# Altium schematic symbol library jlcpcb_2025_04_capacitors_extended_0402.schlib: 3594 symbols (part 18 of 20) (continued)
## RF15NR75B500CT (continued)
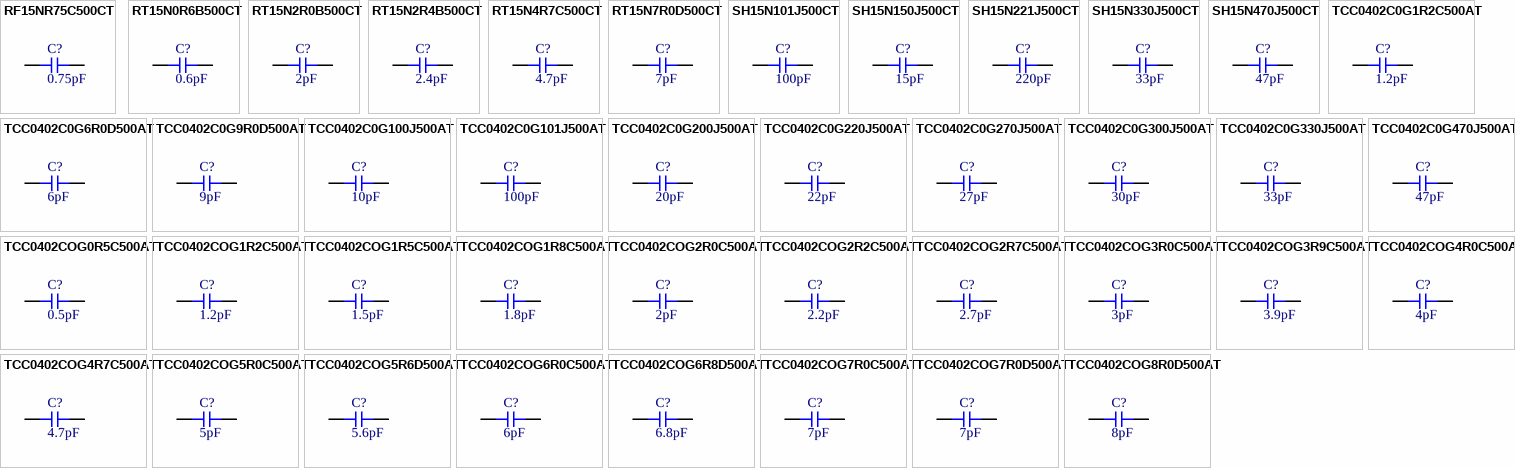
[diagram p81: symbols RF15NR75C500CT to TCC0402COG8R0D500AT]

## RF15NR75C500CT
designator C?  Capacitance: 0.75pF  (hidden comment: *)
Capacitor, Ceramic (MLCC), 0.75pF, 50V, NP0, SMD 0402; Manufacturer: Walsin Tech Corp; Manufacturer Part Number: RF15NR75C500CT; Package Size: 0402; JLCPCB Basic Part: No; JLCPCB Part Number: C304679; Supplier 1: LCSC; Category: Capacitors - MLCC; Supplier Part Number 1: C304679; Voltage Rating: 50V; Temperature Coefficient: NP0; RoHS: Yes; ComponentLink1Description: Datasheet; ComponentLink1URL: https://wmsc.lcsc.com/wmsc/upload/file/pdf/v2/lcsc/2304140030_Walsin-Tech-Corp-RF15NR75C500CT_C304679.pdf; ComponentLink2Description: JLCPCB Part URL; ComponentLink2URL: https://jlcpcb.com/partdetail/C304679; ComponentLink3Description: LCSC Part URL; ComponentLink3URL: https://lcsc.com/product-detail/Multilayer-Ceramic-Capacitors-MLCC---SMD-SMT_Walsin-Tech-Corp-Walsin-Tech-Corp-RF15NR75C500CT_C304679.html
footprint CAP-0402 (0402 (1005M) Capacitor)
pins: 1, 2

## RT15N0R6B500CT
designator C?  Capacitance: 0.6pF  (hidden comment: *)
Capacitor, Ceramic (MLCC), 0.6pF, 50V, NP0, SMD 0402; Manufacturer: Walsin Tech Corp; Manufacturer Part Number: RT15N0R6B500CT; Package Size: 0402; JLCPCB Basic Part: No; JLCPCB Part Number: C2918541; Supplier 1: LCSC; Category: Capacitors - MLCC; Supplier Part Number 1: C2918541; Voltage Rating: 50V; Temperature Coefficient: NP0; RoHS: Yes; ComponentLink1Description: Datasheet; ComponentLink1URL: https://wmsc.lcsc.com/wmsc/upload/file/pdf/v2/lcsc/2111171830_Walsin-Tech-Corp-RT15N0R6B500CT_C2918541.pdf; ComponentLink2Description: JLCPCB Part URL; ComponentLink2URL: https://jlcpcb.com/partdetail/C2918541; ComponentLink3Description: LCSC Part URL; ComponentLink3URL: https://lcsc.com/product-detail/Multilayer-Ceramic-Capacitors-MLCC---SMD-SMT_Walsin-Tech-Corp-Walsin-Tech-Corp-RT15N0R6B500CT_C2918541.html
footprint CAP-0402 (0402 (1005M) Capacitor)
pins: 1, 2

## RT15N2R0B500CT
designator C?  Capacitance: 2pF  (hidden comment: *)
Capacitor, Ceramic (MLCC), 2pF, 50V, NP0, SMD 0402; Manufacturer: Walsin Tech Corp; Manufacturer Part Number: RT15N2R0B500CT; Package Size: 0402; JLCPCB Basic Part: No; JLCPCB Part Number: C2918555; Supplier 1: LCSC; Category: Capacitors - MLCC; Supplier Part Number 1: C2918555; Voltage Rating: 50V; Temperature Coefficient: NP0; RoHS: Yes; ComponentLink1Description: Datasheet; ComponentLink1URL: https://wmsc.lcsc.com/wmsc/upload/file/pdf/v2/lcsc/2111171830_Walsin-Tech-Corp-RT15N2R0B500CT_C2918555.pdf; ComponentLink2Description: JLCPCB Part URL; ComponentLink2URL: https://jlcpcb.com/partdetail/C2918555; ComponentLink3Description: LCSC Part URL; ComponentLink3URL: https://lcsc.com/product-detail/Multilayer-Ceramic-Capacitors-MLCC---SMD-SMT_Walsin-Tech-Corp-Walsin-Tech-Corp-RT15N2R0B500CT_C2918555.html
footprint CAP-0402 (0402 (1005M) Capacitor)
pins: 1, 2

## RT15N2R4B500CT
designator C?  Capacitance: 2.4pF  (hidden comment: *)
Capacitor, Ceramic (MLCC), 2.4pF, 50V, NP0, SMD 0402; Manufacturer: Walsin Tech Corp; Manufacturer Part Number: RT15N2R4B500CT; Package Size: 0402; JLCPCB Basic Part: No; JLCPCB Part Number: C2918582; Supplier 1: LCSC; Category: Capacitors - MLCC; Supplier Part Number 1: C2918582; Voltage Rating: 50V; Temperature Coefficient: NP0; RoHS: Yes; ComponentLink1Description: Datasheet; ComponentLink1URL: https://wmsc.lcsc.com/wmsc/upload/file/pdf/v2/lcsc/2111171830_Walsin-Tech-Corp-RT15N2R4B500CT_C2918582.pdf; ComponentLink2Description: JLCPCB Part URL; ComponentLink2URL: https://jlcpcb.com/partdetail/C2918582; ComponentLink3Description: LCSC Part URL; ComponentLink3URL: https://lcsc.com/product-detail/Multilayer-Ceramic-Capacitors-MLCC---SMD-SMT_Walsin-Tech-Corp-Walsin-Tech-Corp-RT15N2R4B500CT_C2918582.html
footprint CAP-0402 (0402 (1005M) Capacitor)
pins: 1, 2

## RT15N4R7C500CT
designator C?  Capacitance: 4.7pF  (hidden comment: *)
Capacitor, Ceramic (MLCC), 4.7pF, 50V, NP0, SMD 0402; Manufacturer: Walsin Tech Corp; Manufacturer Part Number: RT15N4R7C500CT; Package Size: 0402; JLCPCB Basic Part: No; JLCPCB Part Number: C2918598; Supplier 1: LCSC; Category: Capacitors - MLCC; Supplier Part Number 1: C2918598; Voltage Rating: 50V; Temperature Coefficient: NP0; RoHS: Yes; ComponentLink1Description: Datasheet; ComponentLink1URL: https://wmsc.lcsc.com/wmsc/upload/file/pdf/v2/lcsc/2111171830_Walsin-Tech-Corp-RT15N4R7C500CT_C2918598.pdf; ComponentLink2Description: JLCPCB Part URL; ComponentLink2URL: https://jlcpcb.com/partdetail/C2918598; ComponentLink3Description: LCSC Part URL; ComponentLink3URL: https://lcsc.com/product-detail/Multilayer-Ceramic-Capacitors-MLCC---SMD-SMT_Walsin-Tech-Corp-Walsin-Tech-Corp-RT15N4R7C500CT_C2918598.html
footprint CAP-0402 (0402 (1005M) Capacitor)
pins: 1, 2

## RT15N7R0D500CT
designator C?  Capacitance: 7pF  (hidden comment: *)
Capacitor, Ceramic (MLCC), 7pF, 50V, NP0, SMD 0402; Manufacturer: Walsin Tech Corp; Manufacturer Part Number: RT15N7R0D500CT; Package Size: 0402; JLCPCB Basic Part: No; JLCPCB Part Number: C2918529; Supplier 1: LCSC; Category: Capacitors - MLCC; Supplier Part Number 1: C2918529; Voltage Rating: 50V; Temperature Coefficient: NP0; RoHS: Yes; ComponentLink1Description: Datasheet; ComponentLink1URL: https://wmsc.lcsc.com/wmsc/upload/file/pdf/v2/lcsc/2111171830_Walsin-Tech-Corp-RT15N7R0D500CT_C2918529.pdf; ComponentLink2Description: JLCPCB Part URL; ComponentLink2URL: https://jlcpcb.com/partdetail/C2918529; ComponentLink3Description: LCSC Part URL; ComponentLink3URL: https://lcsc.com/product-detail/Multilayer-Ceramic-Capacitors-MLCC---SMD-SMT_Walsin-Tech-Corp-Walsin-Tech-Corp-RT15N7R0D500CT_C2918529.html
footprint CAP-0402 (0402 (1005M) Capacitor)
pins: 1, 2

## SH15N101J500CT
designator C?  Capacitance: 100pF  (hidden comment: *)
Capacitor, Ceramic (MLCC), 100pF, ±5%, 50V, NP0, ±5%, SMD 0402; Manufacturer: Walsin Tech Corp; Manufacturer Part Number: SH15N101J500CT; Package Size: 0402; JLCPCB Basic Part: No; JLCPCB Part Number: C396886; Supplier 1: LCSC; Category: Capacitors - MLCC; Supplier Part Number 1: C396886; Tolerance: ±5%; Voltage Rating: 50V; Temperature Coefficient: NP0; RoHS: Yes; ComponentLink1Description: Datasheet; ComponentLink1URL: https://wmsc.lcsc.com/wmsc/upload/file/pdf/v2/lcsc/2304140030_Walsin-Tech-Corp-SH15N101J500CT_C396886.pdf; ComponentLink2Description: JLCPCB Part URL; ComponentLink2URL: https://jlcpcb.com/partdetail/C396886; ComponentLink3Description: LCSC Part URL; ComponentLink3URL: https://lcsc.com/product-detail/Multilayer-Ceramic-Capacitors-MLCC---SMD-SMT_Walsin-Tech-Corp-Walsin-Tech-Corp-SH15N101J500CT_C396886.html
footprint CAP-0402 (0402 (1005M) Capacitor)
pins: 1, 2

## SH15N150J500CT
designator C?  Capacitance: 15pF  (hidden comment: *)
Capacitor, Ceramic (MLCC), 15pF, ±5%, 50V, NP0, ±5%, SMD 0402; Manufacturer: Walsin Tech Corp; Manufacturer Part Number: SH15N150J500CT; Package Size: 0402; JLCPCB Basic Part: No; JLCPCB Part Number: C396888; Supplier 1: LCSC; Category: Capacitors - MLCC; Supplier Part Number 1: C396888; Tolerance: ±5%; Voltage Rating: 50V; Temperature Coefficient: NP0; RoHS: Yes; ComponentLink1Description: Datasheet; ComponentLink1URL: https://wmsc.lcsc.com/wmsc/upload/file/pdf/v2/lcsc/2304140030_Walsin-Tech-Corp-SH15N150J500CT_C396888.pdf; ComponentLink2Description: JLCPCB Part URL; ComponentLink2URL: https://jlcpcb.com/partdetail/C396888; ComponentLink3Description: LCSC Part URL; ComponentLink3URL: https://lcsc.com/product-detail/Multilayer-Ceramic-Capacitors-MLCC---SMD-SMT_Walsin-Tech-Corp-Walsin-Tech-Corp-SH15N150J500CT_C396888.html
footprint CAP-0402 (0402 (1005M) Capacitor)
pins: 1, 2

## SH15N221J500CT
designator C?  Capacitance: 220pF  (hidden comment: *)
Capacitor, Ceramic (MLCC), 220pF, ±5%, 50V, NP0, ±5%, SMD 0402; Manufacturer: Walsin Tech Corp; Manufacturer Part Number: SH15N221J500CT; Package Size: 0402; JLCPCB Basic Part: No; JLCPCB Part Number: C396890; Supplier 1: LCSC; Category: Capacitors - MLCC; Supplier Part Number 1: C396890; Tolerance: ±5%; Voltage Rating: 50V; Temperature Coefficient: NP0; RoHS: Yes; ComponentLink1Description: Datasheet; ComponentLink1URL: https://wmsc.lcsc.com/wmsc/upload/file/pdf/v2/lcsc/2304140030_Walsin-Tech-Corp-SH15N221J500CT_C396890.pdf; ComponentLink2Description: JLCPCB Part URL; ComponentLink2URL: https://jlcpcb.com/partdetail/C396890; ComponentLink3Description: LCSC Part URL; ComponentLink3URL: https://lcsc.com/product-detail/Multilayer-Ceramic-Capacitors-MLCC---SMD-SMT_Walsin-Tech-Corp-Walsin-Tech-Corp-SH15N221J500CT_C396890.html
footprint CAP-0402 (0402 (1005M) Capacitor)
pins: 1, 2

## SH15N330J500CT
designator C?  Capacitance: 33pF  (hidden comment: *)
Capacitor, Ceramic (MLCC), 33pF, ±5%, 50V, NP0, ±5%, SMD 0402; Manufacturer: Walsin Tech Corp; Manufacturer Part Number: SH15N330J500CT; Package Size: 0402; JLCPCB Basic Part: No; JLCPCB Part Number: C396891; Supplier 1: LCSC; Category: Capacitors - MLCC; Supplier Part Number 1: C396891; Tolerance: ±5%; Voltage Rating: 50V; Temperature Coefficient: NP0; RoHS: Yes; ComponentLink1Description: Datasheet; ComponentLink1URL: https://wmsc.lcsc.com/wmsc/upload/file/pdf/v2/lcsc/2304140030_Walsin-Tech-Corp-SH15N330J500CT_C396891.pdf; ComponentLink2Description: JLCPCB Part URL; ComponentLink2URL: https://jlcpcb.com/partdetail/C396891; ComponentLink3Description: LCSC Part URL; ComponentLink3URL: https://lcsc.com/product-detail/Multilayer-Ceramic-Capacitors-MLCC---SMD-SMT_Walsin-Tech-Corp-Walsin-Tech-Corp-SH15N330J500CT_C396891.html
footprint CAP-0402 (0402 (1005M) Capacitor)
pins: 1, 2

## SH15N470J500CT
designator C?  Capacitance: 47pF  (hidden comment: *)
Capacitor, Ceramic (MLCC), 47pF, ±5%, 50V, NP0, ±5%, SMD 0402; Manufacturer: Walsin Tech Corp; Manufacturer Part Number: SH15N470J500CT; Package Size: 0402; JLCPCB Basic Part: No; JLCPCB Part Number: C396892; Supplier 1: LCSC; Category: Capacitors - MLCC; Supplier Part Number 1: C396892; Tolerance: ±5%; Voltage Rating: 50V; Temperature Coefficient: NP0; RoHS: Yes; ComponentLink1Description: Datasheet; ComponentLink1URL: https://wmsc.lcsc.com/wmsc/upload/file/pdf/v2/lcsc/1912111437_Walsin-Tech-Corp-SH15N470J500CT_C396892.pdf; ComponentLink2Description: JLCPCB Part URL; ComponentLink2URL: https://jlcpcb.com/partdetail/C396892; ComponentLink3Description: LCSC Part URL; ComponentLink3URL: https://lcsc.com/product-detail/Multilayer-Ceramic-Capacitors-MLCC---SMD-SMT_Walsin-Tech-Corp-Walsin-Tech-Corp-SH15N470J500CT_C396892.html
footprint CAP-0402 (0402 (1005M) Capacitor)
pins: 1, 2

## TCC0402C0G1R2C500AT
designator C?  Capacitance: 1.2pF  (hidden comment: *)
Capacitor, Ceramic (MLCC), 1.2pF, 50V, C0G, SMD 0402; Manufacturer: CCTC; Manufacturer Part Number: TCC0402C0G1R2C500AT; Package Size: 0402; JLCPCB Basic Part: No; JLCPCB Part Number: C466224; Supplier 1: LCSC; Category: Capacitors - MLCC; Supplier Part Number 1: C466224; Voltage Rating: 50V; Temperature Coefficient: C0G; RoHS: Yes; ComponentLink1Description: Datasheet; ComponentLink1URL: https://wmsc.lcsc.com/wmsc/upload/file/pdf/v2/lcsc/2304140030_CCTC-TCC0402C0G1R2C500AT_C466224.pdf; ComponentLink2Description: JLCPCB Part URL; ComponentLink2URL: https://jlcpcb.com/partdetail/C466224; ComponentLink3Description: LCSC Part URL; ComponentLink3URL: https://lcsc.com/product-detail/Multilayer-Ceramic-Capacitors-MLCC---SMD-SMT_CCTC-CCTC-TCC0402C0G1R2C500AT_C466224.html
footprint CAP-0402 (0402 (1005M) Capacitor)
pins: 1, 2

## TCC0402C0G6R0D500AT
designator C?  Capacitance: 6pF  (hidden comment: *)
Capacitor, Ceramic (MLCC), 6pF, 50V, C0G, SMD 0402; Manufacturer: CCTC; Manufacturer Part Number: TCC0402C0G6R0D500AT; Package Size: 0402; JLCPCB Basic Part: No; JLCPCB Part Number: C466231; Supplier 1: LCSC; Category: Capacitors - MLCC; Supplier Part Number 1: C466231; Voltage Rating: 50V; Temperature Coefficient: C0G; RoHS: Yes; ComponentLink1Description: Datasheet; ComponentLink1URL: https://wmsc.lcsc.com/wmsc/upload/file/pdf/v2/lcsc/2304140030_CCTC-TCC0402C0G6R0D500AT_C466231.pdf; ComponentLink2Description: JLCPCB Part URL; ComponentLink2URL: https://jlcpcb.com/partdetail/C466231; ComponentLink3Description: LCSC Part URL; ComponentLink3URL: https://lcsc.com/product-detail/Multilayer-Ceramic-Capacitors-MLCC---SMD-SMT_CCTC-CCTC-TCC0402C0G6R0D500AT_C466231.html
footprint CAP-0402 (0402 (1005M) Capacitor)
pins: 1, 2

## TCC0402C0G9R0D500AT
designator C?  Capacitance: 9pF  (hidden comment: *)
Capacitor, Ceramic (MLCC), 9pF, 50V, C0G, SMD 0402; Manufacturer: CCTC; Manufacturer Part Number: TCC0402C0G9R0D500AT; Package Size: 0402; JLCPCB Basic Part: No; JLCPCB Part Number: C466232; Supplier 1: LCSC; Category: Capacitors - MLCC; Supplier Part Number 1: C466232; Voltage Rating: 50V; Temperature Coefficient: C0G; RoHS: Yes; ComponentLink1Description: Datasheet; ComponentLink1URL: https://wmsc.lcsc.com/wmsc/upload/file/pdf/v2/lcsc/2304140030_CCTC-TCC0402C0G9R0D500AT_C466232.pdf; ComponentLink2Description: JLCPCB Part URL; ComponentLink2URL: https://jlcpcb.com/partdetail/C466232; ComponentLink3Description: LCSC Part URL; ComponentLink3URL: https://lcsc.com/product-detail/Multilayer-Ceramic-Capacitors-MLCC---SMD-SMT_CCTC-CCTC-TCC0402C0G9R0D500AT_C466232.html
footprint CAP-0402 (0402 (1005M) Capacitor)
pins: 1, 2

## TCC0402C0G100J500AT
designator C?  Capacitance: 10pF  (hidden comment: *)
Capacitor, Ceramic (MLCC), 10pF, ±5%, 50V, C0G, ±5%, SMD 0402; Manufacturer: CCTC; Manufacturer Part Number: TCC0402C0G100J500AT; Package Size: 0402; JLCPCB Basic Part: No; JLCPCB Part Number: C466222; Supplier 1: LCSC; Category: Capacitors - MLCC; Supplier Part Number 1: C466222; Tolerance: ±5%; Voltage Rating: 50V; Temperature Coefficient: C0G; RoHS: Yes; ComponentLink1Description: Datasheet; ComponentLink1URL: https://wmsc.lcsc.com/wmsc/upload/file/pdf/v2/lcsc/2304140030_CCTC-TCC0402C0G100J500AT_C466222.pdf; ComponentLink2Description: JLCPCB Part URL; ComponentLink2URL: https://jlcpcb.com/partdetail/C466222; ComponentLink3Description: LCSC Part URL; ComponentLink3URL: https://lcsc.com/product-detail/Multilayer-Ceramic-Capacitors-MLCC---SMD-SMT_CCTC-CCTC-TCC0402C0G100J500AT_C466222.html
footprint CAP-0402 (0402 (1005M) Capacitor)
pins: 1, 2

## TCC0402C0G101J500AT
designator C?  Capacitance: 100pF  (hidden comment: *)
Capacitor, Ceramic (MLCC), 100pF, ±5%, 50V, C0G, ±5%, SMD 0402; Manufacturer: CCTC; Manufacturer Part Number: TCC0402C0G101J500AT; Package Size: 0402; JLCPCB Basic Part: No; JLCPCB Part Number: C466223; Supplier 1: LCSC; Category: Capacitors - MLCC; Supplier Part Number 1: C466223; Tolerance: ±5%; Voltage Rating: 50V; Temperature Coefficient: C0G; RoHS: Yes; ComponentLink1Description: Datasheet; ComponentLink1URL: https://wmsc.lcsc.com/wmsc/upload/file/pdf/v2/lcsc/2304140030_CCTC-TCC0402C0G101J500AT_C466223.pdf; ComponentLink2Description: JLCPCB Part URL; ComponentLink2URL: https://jlcpcb.com/partdetail/C466223; ComponentLink3Description: LCSC Part URL; ComponentLink3URL: https://lcsc.com/product-detail/Multilayer-Ceramic-Capacitors-MLCC---SMD-SMT_CCTC-CCTC-TCC0402C0G101J500AT_C466223.html
footprint CAP-0402 (0402 (1005M) Capacitor)
pins: 1, 2

## TCC0402C0G200J500AT
designator C?  Capacitance: 20pF  (hidden comment: *)
Capacitor, Ceramic (MLCC), 20pF, ±5%, 50V, C0G, ±5%, SMD 0402; Manufacturer: CCTC; Manufacturer Part Number: TCC0402C0G200J500AT; Package Size: 0402; JLCPCB Basic Part: No; JLCPCB Part Number: C466225; Supplier 1: LCSC; Category: Capacitors - MLCC; Supplier Part Number 1: C466225; Tolerance: ±5%; Voltage Rating: 50V; Temperature Coefficient: C0G; RoHS: Yes; ComponentLink1Description: Datasheet; ComponentLink1URL: https://wmsc.lcsc.com/wmsc/upload/file/pdf/v2/lcsc/2304140030_CCTC-TCC0402C0G200J500AT_C466225.pdf; ComponentLink2Description: JLCPCB Part URL; ComponentLink2URL: https://jlcpcb.com/partdetail/C466225; ComponentLink3Description: LCSC Part URL; ComponentLink3URL: https://lcsc.com/product-detail/Multilayer-Ceramic-Capacitors-MLCC---SMD-SMT_CCTC-CCTC-TCC0402C0G200J500AT_C466225.html
footprint CAP-0402 (0402 (1005M) Capacitor)
pins: 1, 2

## TCC0402C0G220J500AT
designator C?  Capacitance: 22pF  (hidden comment: *)
Capacitor, Ceramic (MLCC), 22pF, ±5%, 50V, C0G, ±5%, SMD 0402; Manufacturer: CCTC; Manufacturer Part Number: TCC0402C0G220J500AT; Package Size: 0402; JLCPCB Basic Part: No; JLCPCB Part Number: C466226; Supplier 1: LCSC; Category: Capacitors - MLCC; Supplier Part Number 1: C466226; Tolerance: ±5%; Voltage Rating: 50V; Temperature Coefficient: C0G; RoHS: Yes; ComponentLink1Description: Datasheet; ComponentLink1URL: https://wmsc.lcsc.com/wmsc/upload/file/pdf/v2/lcsc/2304140030_CCTC-TCC0402C0G220J500AT_C466226.pdf; ComponentLink2Description: JLCPCB Part URL; ComponentLink2URL: https://jlcpcb.com/partdetail/C466226; ComponentLink3Description: LCSC Part URL; ComponentLink3URL: https://lcsc.com/product-detail/Multilayer-Ceramic-Capacitors-MLCC---SMD-SMT_CCTC-CCTC-TCC0402C0G220J500AT_C466226.html
footprint CAP-0402 (0402 (1005M) Capacitor)
pins: 1, 2

## TCC0402C0G270J500AT
designator C?  Capacitance: 27pF  (hidden comment: *)
Capacitor, Ceramic (MLCC), 27pF, ±5%, 50V, C0G, ±5%, SMD 0402; Manufacturer: CCTC; Manufacturer Part Number: TCC0402C0G270J500AT; Package Size: 0402; JLCPCB Basic Part: No; JLCPCB Part Number: C466227; Supplier 1: LCSC; Category: Capacitors - MLCC; Supplier Part Number 1: C466227; Tolerance: ±5%; Voltage Rating: 50V; Temperature Coefficient: C0G; RoHS: Yes; ComponentLink1Description: Datasheet; ComponentLink1URL: https://wmsc.lcsc.com/wmsc/upload/file/pdf/v2/lcsc/2304140030_CCTC-TCC0402C0G270J500AT_C466227.pdf; ComponentLink2Description: JLCPCB Part URL; ComponentLink2URL: https://jlcpcb.com/partdetail/C466227; ComponentLink3Description: LCSC Part URL; ComponentLink3URL: https://lcsc.com/product-detail/Multilayer-Ceramic-Capacitors-MLCC---SMD-SMT_CCTC-CCTC-TCC0402C0G270J500AT_C466227.html
footprint CAP-0402 (0402 (1005M) Capacitor)
pins: 1, 2

## TCC0402C0G300J500AT
designator C?  Capacitance: 30pF  (hidden comment: *)
Capacitor, Ceramic (MLCC), 30pF, ±5%, 50V, C0G, ±5%, SMD 0402; Manufacturer: CCTC; Manufacturer Part Number: TCC0402C0G300J500AT; Package Size: 0402; JLCPCB Basic Part: No; JLCPCB Part Number: C466228; Supplier 1: LCSC; Category: Capacitors - MLCC; Supplier Part Number 1: C466228; Tolerance: ±5%; Voltage Rating: 50V; Temperature Coefficient: C0G; RoHS: Yes; ComponentLink1Description: Datasheet; ComponentLink1URL: https://wmsc.lcsc.com/wmsc/upload/file/pdf/v2/lcsc/2304140030_CCTC-TCC0402C0G300J500AT_C466228.pdf; ComponentLink2Description: JLCPCB Part URL; ComponentLink2URL: https://jlcpcb.com/partdetail/C466228; ComponentLink3Description: LCSC Part URL; ComponentLink3URL: https://lcsc.com/product-detail/Multilayer-Ceramic-Capacitors-MLCC---SMD-SMT_CCTC-CCTC-TCC0402C0G300J500AT_C466228.html
footprint CAP-0402 (0402 (1005M) Capacitor)
pins: 1, 2

## TCC0402C0G330J500AT
designator C?  Capacitance: 33pF  (hidden comment: *)
Capacitor, Ceramic (MLCC), 33pF, ±5%, 50V, C0G, ±5%, SMD 0402; Manufacturer: CCTC; Manufacturer Part Number: TCC0402C0G330J500AT; Package Size: 0402; JLCPCB Basic Part: No; JLCPCB Part Number: C466229; Supplier 1: LCSC; Category: Capacitors - MLCC; Supplier Part Number 1: C466229; Tolerance: ±5%; Voltage Rating: 50V; Temperature Coefficient: C0G; RoHS: Yes; ComponentLink1Description: Datasheet; ComponentLink1URL: https://wmsc.lcsc.com/wmsc/upload/file/pdf/v2/lcsc/2304140030_CCTC-TCC0402C0G330J500AT_C466229.pdf; ComponentLink2Description: JLCPCB Part URL; ComponentLink2URL: https://jlcpcb.com/partdetail/C466229; ComponentLink3Description: LCSC Part URL; ComponentLink3URL: https://lcsc.com/product-detail/Multilayer-Ceramic-Capacitors-MLCC---SMD-SMT_CCTC-CCTC-TCC0402C0G330J500AT_C466229.html
footprint CAP-0402 (0402 (1005M) Capacitor)
pins: 1, 2

## TCC0402C0G470J500AT
designator C?  Capacitance: 47pF  (hidden comment: *)
Capacitor, Ceramic (MLCC), 47pF, ±5%, 50V, C0G, ±5%, SMD 0402; Manufacturer: CCTC; Manufacturer Part Number: TCC0402C0G470J500AT; Package Size: 0402; JLCPCB Basic Part: No; JLCPCB Part Number: C466230; Supplier 1: LCSC; Category: Capacitors - MLCC; Supplier Part Number 1: C466230; Tolerance: ±5%; Voltage Rating: 50V; Temperature Coefficient: C0G; RoHS: Yes; ComponentLink1Description: Datasheet; ComponentLink1URL: https://wmsc.lcsc.com/wmsc/upload/file/pdf/v2/lcsc/2304140030_CCTC-TCC0402C0G470J500AT_C466230.pdf; ComponentLink2Description: JLCPCB Part URL; ComponentLink2URL: https://jlcpcb.com/partdetail/C466230; ComponentLink3Description: LCSC Part URL; ComponentLink3URL: https://lcsc.com/product-detail/Multilayer-Ceramic-Capacitors-MLCC---SMD-SMT_CCTC-CCTC-TCC0402C0G470J500AT_C466230.html
footprint CAP-0402 (0402 (1005M) Capacitor)
pins: 1, 2

## TCC0402COG0R5C500AT
designator C?  Capacitance: 0.5pF  (hidden comment: *)
Capacitor, Ceramic (MLCC), 0.5pF, 50V, C0G, SMD 0402; Manufacturer: CCTC; Manufacturer Part Number: TCC0402COG0R5C500AT; Package Size: 0402; JLCPCB Basic Part: No; JLCPCB Part Number: C880655; Supplier 1: LCSC; Category: Capacitors - MLCC; Supplier Part Number 1: C880655; Voltage Rating: 50V; Temperature Coefficient: C0G; RoHS: Yes; ComponentLink1Description: Datasheet; ComponentLink1URL: https://wmsc.lcsc.com/wmsc/upload/file/pdf/v2/lcsc/2204121745_CCTC-TCC0402COG0R5C500AT_C880655.pdf; ComponentLink2Description: JLCPCB Part URL; ComponentLink2URL: https://jlcpcb.com/partdetail/C880655; ComponentLink3Description: LCSC Part URL; ComponentLink3URL: https://lcsc.com/product-detail/Multilayer-Ceramic-Capacitors-MLCC---SMD-SMT_CCTC-CCTC-TCC0402COG0R5C500AT_C880655.html
footprint CAP-0402 (0402 (1005M) Capacitor)
pins: 1, 2

## TCC0402COG1R2C500AT
designator C?  Capacitance: 1.2pF  (hidden comment: *)
Capacitor, Ceramic (MLCC), 1.2pF, 50V, C0G, SMD 0402; Manufacturer: CCTC; Manufacturer Part Number: TCC0402COG1R2C500AT; Package Size: 0402; JLCPCB Basic Part: No; JLCPCB Part Number: C880658; Supplier 1: LCSC; Category: Capacitors - MLCC; Supplier Part Number 1: C880658; Voltage Rating: 50V; Temperature Coefficient: C0G; RoHS: Yes; ComponentLink1Description: Datasheet; ComponentLink1URL: https://wmsc.lcsc.com/wmsc/upload/file/pdf/v2/lcsc/2304140030_CCTC-TCC0402COG1R2C500AT_C880658.pdf; ComponentLink2Description: JLCPCB Part URL; ComponentLink2URL: https://jlcpcb.com/partdetail/C880658; ComponentLink3Description: LCSC Part URL; ComponentLink3URL: https://lcsc.com/product-detail/Multilayer-Ceramic-Capacitors-MLCC---SMD-SMT_CCTC-CCTC-TCC0402COG1R2C500AT_C880658.html
footprint CAP-0402 (0402 (1005M) Capacitor)
pins: 1, 2

## TCC0402COG1R5C500AT
designator C?  Capacitance: 1.5pF  (hidden comment: *)
Capacitor, Ceramic (MLCC), 1.5pF, 50V, C0G, SMD 0402; Manufacturer: CCTC; Manufacturer Part Number: TCC0402COG1R5C500AT; Package Size: 0402; JLCPCB Basic Part: No; JLCPCB Part Number: C880661; Supplier 1: LCSC; Category: Capacitors - MLCC; Supplier Part Number 1: C880661; Voltage Rating: 50V; Temperature Coefficient: C0G; RoHS: Yes; ComponentLink1Description: Datasheet; ComponentLink1URL: https://wmsc.lcsc.com/wmsc/upload/file/pdf/v2/lcsc/2304140030_CCTC-TCC0402COG1R5C500AT_C880661.pdf; ComponentLink2Description: JLCPCB Part URL; ComponentLink2URL: https://jlcpcb.com/partdetail/C880661; ComponentLink3Description: LCSC Part URL; ComponentLink3URL: https://lcsc.com/product-detail/Multilayer-Ceramic-Capacitors-MLCC---SMD-SMT_CCTC-CCTC-TCC0402COG1R5C500AT_C880661.html
footprint CAP-0402 (0402 (1005M) Capacitor)
pins: 1, 2

## TCC0402COG1R8C500AT
designator C?  Capacitance: 1.8pF  (hidden comment: *)
Capacitor, Ceramic (MLCC), 1.8pF, 50V, C0G, SMD 0402; Manufacturer: CCTC; Manufacturer Part Number: TCC0402COG1R8C500AT; Package Size: 0402; JLCPCB Basic Part: No; JLCPCB Part Number: C880631; Supplier 1: LCSC; Category: Capacitors - MLCC; Supplier Part Number 1: C880631; Voltage Rating: 50V; Temperature Coefficient: C0G; RoHS: Yes; ComponentLink1Description: Datasheet; ComponentLink1URL: https://wmsc.lcsc.com/wmsc/upload/file/pdf/v2/lcsc/2304140030_CCTC-TCC0402COG1R8C500AT_C880631.pdf; ComponentLink2Description: JLCPCB Part URL; ComponentLink2URL: https://jlcpcb.com/partdetail/C880631; ComponentLink3Description: LCSC Part URL; ComponentLink3URL: https://lcsc.com/product-detail/Multilayer-Ceramic-Capacitors-MLCC---SMD-SMT_CCTC-CCTC-TCC0402COG1R8C500AT_C880631.html
footprint CAP-0402 (0402 (1005M) Capacitor)
pins: 1, 2

## TCC0402COG2R0C500AT
designator C?  Capacitance: 2pF  (hidden comment: *)
Capacitor, Ceramic (MLCC), 2pF, 50V, C0G, SMD 0402; Manufacturer: CCTC; Manufacturer Part Number: TCC0402COG2R0C500AT; Package Size: 0402; JLCPCB Basic Part: No; JLCPCB Part Number: C696885; Supplier 1: LCSC; Category: Capacitors - MLCC; Supplier Part Number 1: C696885; Voltage Rating: 50V; Temperature Coefficient: C0G; RoHS: Yes; ComponentLink1Description: Datasheet; ComponentLink1URL: https://wmsc.lcsc.com/wmsc/upload/file/pdf/v2/lcsc/2304140030_CCTC-TCC0402COG2R0C500AT_C696885.pdf; ComponentLink2Description: JLCPCB Part URL; ComponentLink2URL: https://jlcpcb.com/partdetail/C696885; ComponentLink3Description: LCSC Part URL; ComponentLink3URL: https://lcsc.com/product-detail/Multilayer-Ceramic-Capacitors-MLCC---SMD-SMT_CCTC-CCTC-TCC0402COG2R0C500AT_C696885.html
footprint CAP-0402 (0402 (1005M) Capacitor)
pins: 1, 2

## TCC0402COG2R2C500AT
designator C?  Capacitance: 2.2pF  (hidden comment: *)
Capacitor, Ceramic (MLCC), 2.2pF, 50V, C0G, SMD 0402; Manufacturer: CCTC; Manufacturer Part Number: TCC0402COG2R2C500AT; Package Size: 0402; JLCPCB Basic Part: No; JLCPCB Part Number: C880648; Supplier 1: LCSC; Category: Capacitors - MLCC; Supplier Part Number 1: C880648; Voltage Rating: 50V; Temperature Coefficient: C0G; RoHS: Yes; ComponentLink1Description: Datasheet; ComponentLink1URL: https://wmsc.lcsc.com/wmsc/upload/file/pdf/v2/lcsc/2304140030_CCTC-TCC0402COG2R2C500AT_C880648.pdf; ComponentLink2Description: JLCPCB Part URL; ComponentLink2URL: https://jlcpcb.com/partdetail/C880648; ComponentLink3Description: LCSC Part URL; ComponentLink3URL: https://lcsc.com/product-detail/Multilayer-Ceramic-Capacitors-MLCC---SMD-SMT_CCTC-CCTC-TCC0402COG2R2C500AT_C880648.html
footprint CAP-0402 (0402 (1005M) Capacitor)
pins: 1, 2

## TCC0402COG2R7C500AT
designator C?  Capacitance: 2.7pF  (hidden comment: *)
Capacitor, Ceramic (MLCC), 2.7pF, 50V, C0G, SMD 0402; Manufacturer: CCTC; Manufacturer Part Number: TCC0402COG2R7C500AT; Package Size: 0402; JLCPCB Basic Part: No; JLCPCB Part Number: C696884; Supplier 1: LCSC; Category: Capacitors - MLCC; Supplier Part Number 1: C696884; Voltage Rating: 50V; Temperature Coefficient: C0G; RoHS: Yes; ComponentLink1Description: Datasheet; ComponentLink1URL: https://wmsc.lcsc.com/wmsc/upload/file/pdf/v2/lcsc/2304140030_CCTC-TCC0402COG2R7C500AT_C696884.pdf; ComponentLink2Description: JLCPCB Part URL; ComponentLink2URL: https://jlcpcb.com/partdetail/C696884; ComponentLink3Description: LCSC Part URL; ComponentLink3URL: https://lcsc.com/product-detail/Multilayer-Ceramic-Capacitors-MLCC---SMD-SMT_CCTC-CCTC-TCC0402COG2R7C500AT_C696884.html
footprint CAP-0402 (0402 (1005M) Capacitor)
pins: 1, 2

## TCC0402COG3R0C500AT
designator C?  Capacitance: 3pF  (hidden comment: *)
Capacitor, Ceramic (MLCC), 3pF, 50V, C0G, SMD 0402; Manufacturer: CCTC; Manufacturer Part Number: TCC0402COG3R0C500AT; Package Size: 0402; JLCPCB Basic Part: No; JLCPCB Part Number: C696883; Supplier 1: LCSC; Category: Capacitors - MLCC; Supplier Part Number 1: C696883; Voltage Rating: 50V; Temperature Coefficient: C0G; RoHS: Yes; ComponentLink1Description: Datasheet; ComponentLink1URL: https://wmsc.lcsc.com/wmsc/upload/file/pdf/v2/lcsc/2304140030_CCTC-TCC0402COG3R0C500AT_C696883.pdf; ComponentLink2Description: JLCPCB Part URL; ComponentLink2URL: https://jlcpcb.com/partdetail/C696883; ComponentLink3Description: LCSC Part URL; ComponentLink3URL: https://lcsc.com/product-detail/Multilayer-Ceramic-Capacitors-MLCC---SMD-SMT_CCTC-CCTC-TCC0402COG3R0C500AT_C696883.html
footprint CAP-0402 (0402 (1005M) Capacitor)
pins: 1, 2

## TCC0402COG3R9C500AT
designator C?  Capacitance: 3.9pF  (hidden comment: *)
Capacitor, Ceramic (MLCC), 3.9pF, 50V, C0G, SMD 0402; Manufacturer: CCTC; Manufacturer Part Number: TCC0402COG3R9C500AT; Package Size: 0402; JLCPCB Basic Part: No; JLCPCB Part Number: C696882; Supplier 1: LCSC; Category: Capacitors - MLCC; Supplier Part Number 1: C696882; Voltage Rating: 50V; Temperature Coefficient: C0G; RoHS: Yes; ComponentLink1Description: Datasheet; ComponentLink1URL: https://wmsc.lcsc.com/wmsc/upload/file/pdf/v2/lcsc/2304140030_CCTC-TCC0402COG3R9C500AT_C696882.pdf; ComponentLink2Description: JLCPCB Part URL; ComponentLink2URL: https://jlcpcb.com/partdetail/C696882; ComponentLink3Description: LCSC Part URL; ComponentLink3URL: https://lcsc.com/product-detail/Multilayer-Ceramic-Capacitors-MLCC---SMD-SMT_CCTC-CCTC-TCC0402COG3R9C500AT_C696882.html
footprint CAP-0402 (0402 (1005M) Capacitor)
pins: 1, 2

## TCC0402COG4R0C500AT
designator C?  Capacitance: 4pF  (hidden comment: *)
Capacitor, Ceramic (MLCC), 4pF, 50V, C0G, SMD 0402; Manufacturer: CCTC; Manufacturer Part Number: TCC0402COG4R0C500AT; Package Size: 0402; JLCPCB Basic Part: No; JLCPCB Part Number: C696875; Supplier 1: LCSC; Category: Capacitors - MLCC; Supplier Part Number 1: C696875; Voltage Rating: 50V; Temperature Coefficient: C0G; RoHS: Yes; ComponentLink1Description: Datasheet; ComponentLink1URL: https://wmsc.lcsc.com/wmsc/upload/file/pdf/v2/lcsc/2304140030_CCTC-TCC0402COG4R0C500AT_C696875.pdf; ComponentLink2Description: JLCPCB Part URL; ComponentLink2URL: https://jlcpcb.com/partdetail/C696875; ComponentLink3Description: LCSC Part URL; ComponentLink3URL: https://lcsc.com/product-detail/Multilayer-Ceramic-Capacitors-MLCC---SMD-SMT_CCTC-CCTC-TCC0402COG4R0C500AT_C696875.html
footprint CAP-0402 (0402 (1005M) Capacitor)
pins: 1, 2

## TCC0402COG4R7C500AT
designator C?  Capacitance: 4.7pF  (hidden comment: *)
Capacitor, Ceramic (MLCC), 4.7pF, 50V, C0G, SMD 0402; Manufacturer: CCTC; Manufacturer Part Number: TCC0402COG4R7C500AT; Package Size: 0402; JLCPCB Basic Part: No; JLCPCB Part Number: C696881; Supplier 1: LCSC; Category: Capacitors - MLCC; Supplier Part Number 1: C696881; Voltage Rating: 50V; Temperature Coefficient: C0G; RoHS: Yes; ComponentLink1Description: Datasheet; ComponentLink1URL: https://wmsc.lcsc.com/wmsc/upload/file/pdf/v2/lcsc/2304140030_CCTC-TCC0402COG4R7C500AT_C696881.pdf; ComponentLink2Description: JLCPCB Part URL; ComponentLink2URL: https://jlcpcb.com/partdetail/C696881; ComponentLink3Description: LCSC Part URL; ComponentLink3URL: https://lcsc.com/product-detail/Multilayer-Ceramic-Capacitors-MLCC---SMD-SMT_CCTC-CCTC-TCC0402COG4R7C500AT_C696881.html
footprint CAP-0402 (0402 (1005M) Capacitor)
pins: 1, 2

## TCC0402COG5R0C500AT
designator C?  Capacitance: 5pF  (hidden comment: *)
Capacitor, Ceramic (MLCC), 5pF, 50V, C0G, SMD 0402; Manufacturer: CCTC; Manufacturer Part Number: TCC0402COG5R0C500AT; Package Size: 0402; JLCPCB Basic Part: No; JLCPCB Part Number: C880630; Supplier 1: LCSC; Category: Capacitors - MLCC; Supplier Part Number 1: C880630; Voltage Rating: 50V; Temperature Coefficient: C0G; RoHS: Yes; ComponentLink1Description: Datasheet; ComponentLink1URL: https://wmsc.lcsc.com/wmsc/upload/file/pdf/v2/lcsc/2304140030_CCTC-TCC0402COG5R0C500AT_C880630.pdf; ComponentLink2Description: JLCPCB Part URL; ComponentLink2URL: https://jlcpcb.com/partdetail/C880630; ComponentLink3Description: LCSC Part URL; ComponentLink3URL: https://lcsc.com/product-detail/Multilayer-Ceramic-Capacitors-MLCC---SMD-SMT_CCTC-CCTC-TCC0402COG5R0C500AT_C880630.html
footprint CAP-0402 (0402 (1005M) Capacitor)
pins: 1, 2

## TCC0402COG5R6D500AT
designator C?  Capacitance: 5.6pF  (hidden comment: *)
Capacitor, Ceramic (MLCC), 5.6pF, 50V, C0G, SMD 0402; Manufacturer: CCTC; Manufacturer Part Number: TCC0402COG5R6D500AT; Package Size: 0402; JLCPCB Basic Part: No; JLCPCB Part Number: C696880; Supplier 1: LCSC; Category: Capacitors - MLCC; Supplier Part Number 1: C696880; Voltage Rating: 50V; Temperature Coefficient: C0G; RoHS: Yes; ComponentLink1Description: Datasheet; ComponentLink1URL: https://wmsc.lcsc.com/wmsc/upload/file/pdf/v2/lcsc/2304140030_CCTC-TCC0402COG5R6D500AT_C696880.pdf; ComponentLink2Description: JLCPCB Part URL; ComponentLink2URL: https://jlcpcb.com/partdetail/C696880; ComponentLink3Description: LCSC Part URL; ComponentLink3URL: https://lcsc.com/product-detail/Multilayer-Ceramic-Capacitors-MLCC---SMD-SMT_CCTC-CCTC-TCC0402COG5R6D500AT_C696880.html
footprint CAP-0402 (0402 (1005M) Capacitor)
pins: 1, 2

## TCC0402COG6R0C500AT
designator C?  Capacitance: 6pF  (hidden comment: *)
Capacitor, Ceramic (MLCC), 6pF, 50V, C0G, SMD 0402; Manufacturer: CCTC; Manufacturer Part Number: TCC0402COG6R0C500AT; Package Size: 0402; JLCPCB Basic Part: No; JLCPCB Part Number: C696878; Supplier 1: LCSC; Category: Capacitors - MLCC; Supplier Part Number 1: C696878; Voltage Rating: 50V; Temperature Coefficient: C0G; RoHS: Yes; ComponentLink1Description: Datasheet; ComponentLink1URL: https://wmsc.lcsc.com/wmsc/upload/file/pdf/v2/lcsc/2304140030_CCTC-TCC0402COG6R0C500AT_C696878.pdf; ComponentLink2Description: JLCPCB Part URL; ComponentLink2URL: https://jlcpcb.com/partdetail/C696878; ComponentLink3Description: LCSC Part URL; ComponentLink3URL: https://lcsc.com/product-detail/Multilayer-Ceramic-Capacitors-MLCC---SMD-SMT_CCTC-CCTC-TCC0402COG6R0C500AT_C696878.html
footprint CAP-0402 (0402 (1005M) Capacitor)
pins: 1, 2

## TCC0402COG6R8D500AT
designator C?  Capacitance: 6.8pF  (hidden comment: *)
Capacitor, Ceramic (MLCC), 6.8pF, 50V, C0G, SMD 0402; Manufacturer: CCTC; Manufacturer Part Number: TCC0402COG6R8D500AT; Package Size: 0402; JLCPCB Basic Part: No; JLCPCB Part Number: C880645; Supplier 1: LCSC; Category: Capacitors - MLCC; Supplier Part Number 1: C880645; Voltage Rating: 50V; Temperature Coefficient: C0G; RoHS: Yes; ComponentLink1Description: Datasheet; ComponentLink1URL: https://wmsc.lcsc.com/wmsc/upload/file/pdf/v2/lcsc/2304140030_CCTC-TCC0402COG6R8D500AT_C880645.pdf; ComponentLink2Description: JLCPCB Part URL; ComponentLink2URL: https://jlcpcb.com/partdetail/C880645; ComponentLink3Description: LCSC Part URL; ComponentLink3URL: https://lcsc.com/product-detail/Multilayer-Ceramic-Capacitors-MLCC---SMD-SMT_CCTC-CCTC-TCC0402COG6R8D500AT_C880645.html
footprint CAP-0402 (0402 (1005M) Capacitor)
pins: 1, 2

## TCC0402COG7R0C500AT
designator C?  Capacitance: 7pF  (hidden comment: *)
Capacitor, Ceramic (MLCC), 7pF, 50V, null, SMD 0402; Manufacturer: CCTC; Manufacturer Part Number: TCC0402COG7R0C500AT; Package Size: 0402; JLCPCB Basic Part: No; JLCPCB Part Number: C5448838; Supplier 1: LCSC; Category: Capacitors - MLCC; Supplier Part Number 1: C5448838; Voltage Rating: 50V; Temperature Coefficient: null; RoHS: Yes; ComponentLink1Description: Datasheet; ComponentLink1URL: https://wmsc.lcsc.com/wmsc/upload/file/pdf/v2/lcsc/2403281712_CCTC-TCC0402COG7R0C500AT_C5448838.pdf; ComponentLink2Description: JLCPCB Part URL; ComponentLink2URL: https://jlcpcb.com/partdetail/C5448838; ComponentLink3Description: LCSC Part URL; ComponentLink3URL: https://lcsc.com/product-detail/Multilayer-Ceramic-Capacitors-MLCC---SMD-SMT_CCTC-CCTC-TCC0402COG7R0C500AT_C5448838.html
footprint CAP-0402 (0402 (1005M) Capacitor)
pins: 1, 2

## TCC0402COG7R0D500AT
designator C?  Capacitance: 7pF  (hidden comment: *)
Capacitor, Ceramic (MLCC), 7pF, 50V, C0G, SMD 0402; Manufacturer: CCTC; Manufacturer Part Number: TCC0402COG7R0D500AT; Package Size: 0402; JLCPCB Basic Part: No; JLCPCB Part Number: C696877; Supplier 1: LCSC; Category: Capacitors - MLCC; Supplier Part Number 1: C696877; Voltage Rating: 50V; Temperature Coefficient: C0G; RoHS: Yes; ComponentLink1Description: Datasheet; ComponentLink1URL: https://wmsc.lcsc.com/wmsc/upload/file/pdf/v2/lcsc/2304140030_CCTC-TCC0402COG7R0D500AT_C696877.pdf; ComponentLink2Description: JLCPCB Part URL; ComponentLink2URL: https://jlcpcb.com/partdetail/C696877; ComponentLink3Description: LCSC Part URL; ComponentLink3URL: https://lcsc.com/product-detail/Multilayer-Ceramic-Capacitors-MLCC---SMD-SMT_CCTC-CCTC-TCC0402COG7R0D500AT_C696877.html
footprint CAP-0402 (0402 (1005M) Capacitor)
pins: 1, 2

## TCC0402COG8R0D500AT
designator C?  Capacitance: 8pF  (hidden comment: *)
Capacitor, Ceramic (MLCC), 8pF, 50V, C0G, SMD 0402; Manufacturer: CCTC; Manufacturer Part Number: TCC0402COG8R0D500AT; Package Size: 0402; JLCPCB Basic Part: No; JLCPCB Part Number: C880622; Supplier 1: LCSC; Category: Capacitors - MLCC; Supplier Part Number 1: C880622; Voltage Rating: 50V; Temperature Coefficient: C0G; RoHS: Yes; ComponentLink1Description: Datasheet; ComponentLink1URL: https://wmsc.lcsc.com/wmsc/upload/file/pdf/v2/lcsc/2304140030_CCTC-TCC0402COG8R0D500AT_C880622.pdf; ComponentLink2Description: JLCPCB Part URL; ComponentLink2URL: https://jlcpcb.com/partdetail/C880622; ComponentLink3Description: LCSC Part URL; ComponentLink3URL: https://lcsc.com/product-detail/Multilayer-Ceramic-Capacitors-MLCC---SMD-SMT_CCTC-CCTC-TCC0402COG8R0D500AT_C880622.html
footprint CAP-0402 (0402 (1005M) Capacitor)
pins: 1, 2

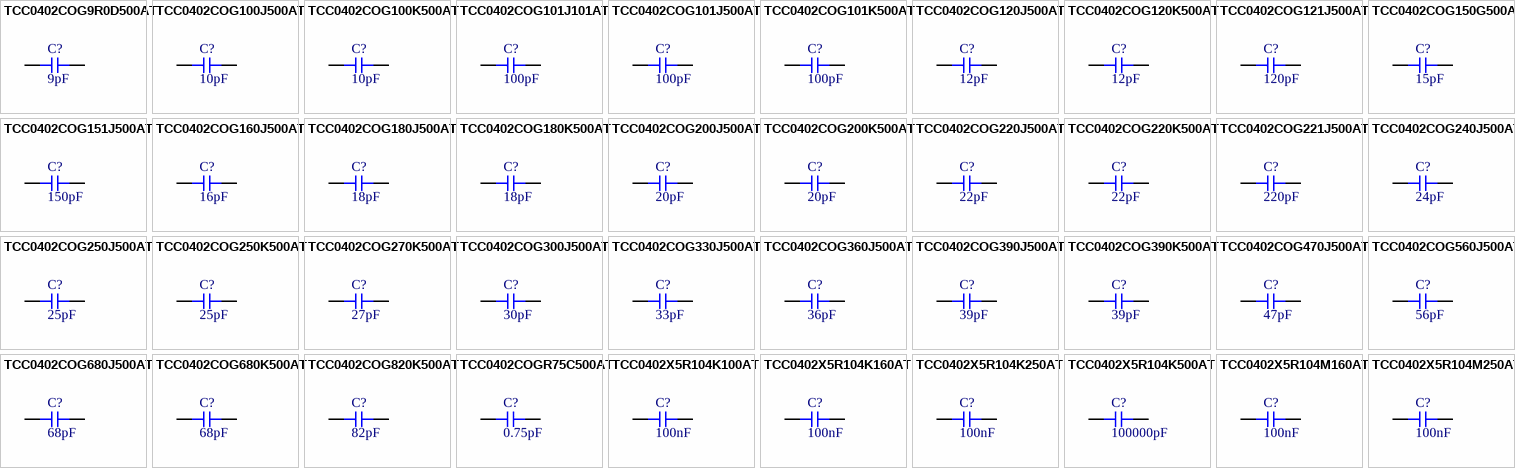
[diagram p82: symbols TCC0402COG9R0D500AT to TCC0402X5R104M250AT]

## TCC0402COG9R0D500AT
designator C?  Capacitance: 9pF  (hidden comment: *)
Capacitor, Ceramic (MLCC), 9pF, 50V, C0G, SMD 0402; Manufacturer: CCTC; Manufacturer Part Number: TCC0402COG9R0D500AT; Package Size: 0402; JLCPCB Basic Part: No; JLCPCB Part Number: C696893; Supplier 1: LCSC; Category: Capacitors - MLCC; Supplier Part Number 1: C696893; Voltage Rating: 50V; Temperature Coefficient: C0G; RoHS: Yes; ComponentLink1Description: Datasheet; ComponentLink1URL: https://wmsc.lcsc.com/wmsc/upload/file/pdf/v2/lcsc/2304140030_CCTC-TCC0402COG9R0D500AT_C696893.pdf; ComponentLink2Description: JLCPCB Part URL; ComponentLink2URL: https://jlcpcb.com/partdetail/C696893; ComponentLink3Description: LCSC Part URL; ComponentLink3URL: https://lcsc.com/product-detail/Multilayer-Ceramic-Capacitors-MLCC---SMD-SMT_CCTC-CCTC-TCC0402COG9R0D500AT_C696893.html
footprint CAP-0402 (0402 (1005M) Capacitor)
pins: 1, 2

## TCC0402COG100J500AT
designator C?  Capacitance: 10pF  (hidden comment: *)
Capacitor, Ceramic (MLCC), 10pF, ±5%, 50V, C0G, ±5%, SMD 0402; Manufacturer: CCTC; Manufacturer Part Number: TCC0402COG100J500AT; Package Size: 0402; JLCPCB Basic Part: No; JLCPCB Part Number: C696913; Supplier 1: LCSC; Category: Capacitors - MLCC; Supplier Part Number 1: C696913; Tolerance: ±5%; Voltage Rating: 50V; Temperature Coefficient: C0G; RoHS: Yes; ComponentLink1Description: Datasheet; ComponentLink1URL: https://wmsc.lcsc.com/wmsc/upload/file/pdf/v2/lcsc/2304140030_CCTC-TCC0402COG100J500AT_C696913.pdf; ComponentLink2Description: JLCPCB Part URL; ComponentLink2URL: https://jlcpcb.com/partdetail/C696913; ComponentLink3Description: LCSC Part URL; ComponentLink3URL: https://lcsc.com/product-detail/Multilayer-Ceramic-Capacitors-MLCC---SMD-SMT_CCTC-CCTC-TCC0402COG100J500AT_C696913.html
footprint CAP-0402 (0402 (1005M) Capacitor)
pins: 1, 2

## TCC0402COG100K500AT
designator C?  Capacitance: 10pF  (hidden comment: *)
Capacitor, Ceramic (MLCC), 10pF, ±10%, 50V, C0G, ±10%, SMD 0402; Manufacturer: CCTC; Manufacturer Part Number: TCC0402COG100K500AT; Package Size: 0402; JLCPCB Basic Part: No; JLCPCB Part Number: C713505; Supplier 1: LCSC; Category: Capacitors - MLCC; Supplier Part Number 1: C713505; Tolerance: ±10%; Voltage Rating: 50V; Temperature Coefficient: C0G; RoHS: Yes; ComponentLink1Description: Datasheet; ComponentLink1URL: https://wmsc.lcsc.com/wmsc/upload/file/pdf/v2/lcsc/2304140030_CCTC-TCC0402COG100K500AT_C713505.pdf; ComponentLink2Description: JLCPCB Part URL; ComponentLink2URL: https://jlcpcb.com/partdetail/C713505; ComponentLink3Description: LCSC Part URL; ComponentLink3URL: https://lcsc.com/product-detail/Multilayer-Ceramic-Capacitors-MLCC---SMD-SMT_CCTC-CCTC-TCC0402COG100K500AT_C713505.html
footprint CAP-0402 (0402 (1005M) Capacitor)
pins: 1, 2

## TCC0402COG101J101AT
designator C?  Capacitance: 100pF  (hidden comment: *)
Capacitor, Ceramic (MLCC), 100pF, ±5%, 100V, null, ±5%, SMD 0402; Manufacturer: CCTC; Manufacturer Part Number: TCC0402COG101J101AT; Package Size: 0402; JLCPCB Basic Part: No; JLCPCB Part Number: C7393839; Supplier 1: LCSC; Category: Capacitors - MLCC; Supplier Part Number 1: C7393839; Tolerance: ±5%; Voltage Rating: 100V; Temperature Coefficient: null; RoHS: Yes; ComponentLink1Description: Datasheet; ComponentLink1URL: https://wmsc.lcsc.com/wmsc/upload/file/pdf/v2/lcsc/2306211554_CCTC-TCC0402COG101J101AT_C7393839.pdf; ComponentLink2Description: JLCPCB Part URL; ComponentLink2URL: https://jlcpcb.com/partdetail/C7393839; ComponentLink3Description: LCSC Part URL; ComponentLink3URL: https://lcsc.com/product-detail/Multilayer-Ceramic-Capacitors-MLCC---SMD-SMT_CCTC-CCTC-TCC0402COG101J101AT_C7393839.html
footprint CAP-0402 (0402 (1005M) Capacitor)
pins: 1, 2

## TCC0402COG101J500AT
designator C?  Capacitance: 100pF  (hidden comment: *)
Capacitor, Ceramic (MLCC), 100pF, ±5%, 50V, C0G, ±5%, SMD 0402; Manufacturer: CCTC; Manufacturer Part Number: TCC0402COG101J500AT; Package Size: 0402; JLCPCB Basic Part: No; JLCPCB Part Number: C696847; Supplier 1: LCSC; Category: Capacitors - MLCC; Supplier Part Number 1: C696847; Tolerance: ±5%; Voltage Rating: 50V; Temperature Coefficient: C0G; RoHS: Yes; ComponentLink1Description: Datasheet; ComponentLink1URL: https://wmsc.lcsc.com/wmsc/upload/file/pdf/v2/lcsc/2304140030_CCTC-TCC0402COG101J500AT_C696847.pdf; ComponentLink2Description: JLCPCB Part URL; ComponentLink2URL: https://jlcpcb.com/partdetail/C696847; ComponentLink3Description: LCSC Part URL; ComponentLink3URL: https://lcsc.com/product-detail/Multilayer-Ceramic-Capacitors-MLCC---SMD-SMT_CCTC-CCTC-TCC0402COG101J500AT_C696847.html
footprint CAP-0402 (0402 (1005M) Capacitor)
pins: 1, 2

## TCC0402COG101K500AT
designator C?  Capacitance: 100pF  (hidden comment: *)
Capacitor, Ceramic (MLCC), 100pF, ±10%, 50V, C0G, ±10%, SMD 0402; Manufacturer: CCTC; Manufacturer Part Number: TCC0402COG101K500AT; Package Size: 0402; JLCPCB Basic Part: No; JLCPCB Part Number: C696853; Supplier 1: LCSC; Category: Capacitors - MLCC; Supplier Part Number 1: C696853; Tolerance: ±10%; Voltage Rating: 50V; Temperature Coefficient: C0G; RoHS: Yes; ComponentLink1Description: Datasheet; ComponentLink1URL: https://wmsc.lcsc.com/wmsc/upload/file/pdf/v2/lcsc/2304140030_CCTC-TCC0402COG101K500AT_C696853.pdf; ComponentLink2Description: JLCPCB Part URL; ComponentLink2URL: https://jlcpcb.com/partdetail/C696853; ComponentLink3Description: LCSC Part URL; ComponentLink3URL: https://lcsc.com/product-detail/Multilayer-Ceramic-Capacitors-MLCC---SMD-SMT_CCTC-CCTC-TCC0402COG101K500AT_C696853.html
footprint CAP-0402 (0402 (1005M) Capacitor)
pins: 1, 2

## TCC0402COG120J500AT
designator C?  Capacitance: 12pF  (hidden comment: *)
Capacitor, Ceramic (MLCC), 12pF, ±5%, 50V, C0G, ±5%, SMD 0402; Manufacturer: CCTC; Manufacturer Part Number: TCC0402COG120J500AT; Package Size: 0402; JLCPCB Basic Part: No; JLCPCB Part Number: C696888; Supplier 1: LCSC; Category: Capacitors - MLCC; Supplier Part Number 1: C696888; Tolerance: ±5%; Voltage Rating: 50V; Temperature Coefficient: C0G; RoHS: Yes; ComponentLink1Description: Datasheet; ComponentLink1URL: https://wmsc.lcsc.com/wmsc/upload/file/pdf/v2/lcsc/2304140030_CCTC-TCC0402COG120J500AT_C696888.pdf; ComponentLink2Description: JLCPCB Part URL; ComponentLink2URL: https://jlcpcb.com/partdetail/C696888; ComponentLink3Description: LCSC Part URL; ComponentLink3URL: https://lcsc.com/product-detail/Multilayer-Ceramic-Capacitors-MLCC---SMD-SMT_CCTC-CCTC-TCC0402COG120J500AT_C696888.html
footprint CAP-0402 (0402 (1005M) Capacitor)
pins: 1, 2
